# Altium footprint library SMD Passive.PcbLib: 136 footprints (part 2 of 9)
Each footprint in its own frame and in the unit in brackets; x right, y up, seen from the top. Pads: shape width x height; smd on the part's side, far side on the other; paste and mask are expansions set on the pad; w line width, h text height; cw(c..) or ccw(c..) is an arc to the next point about the centre after c.
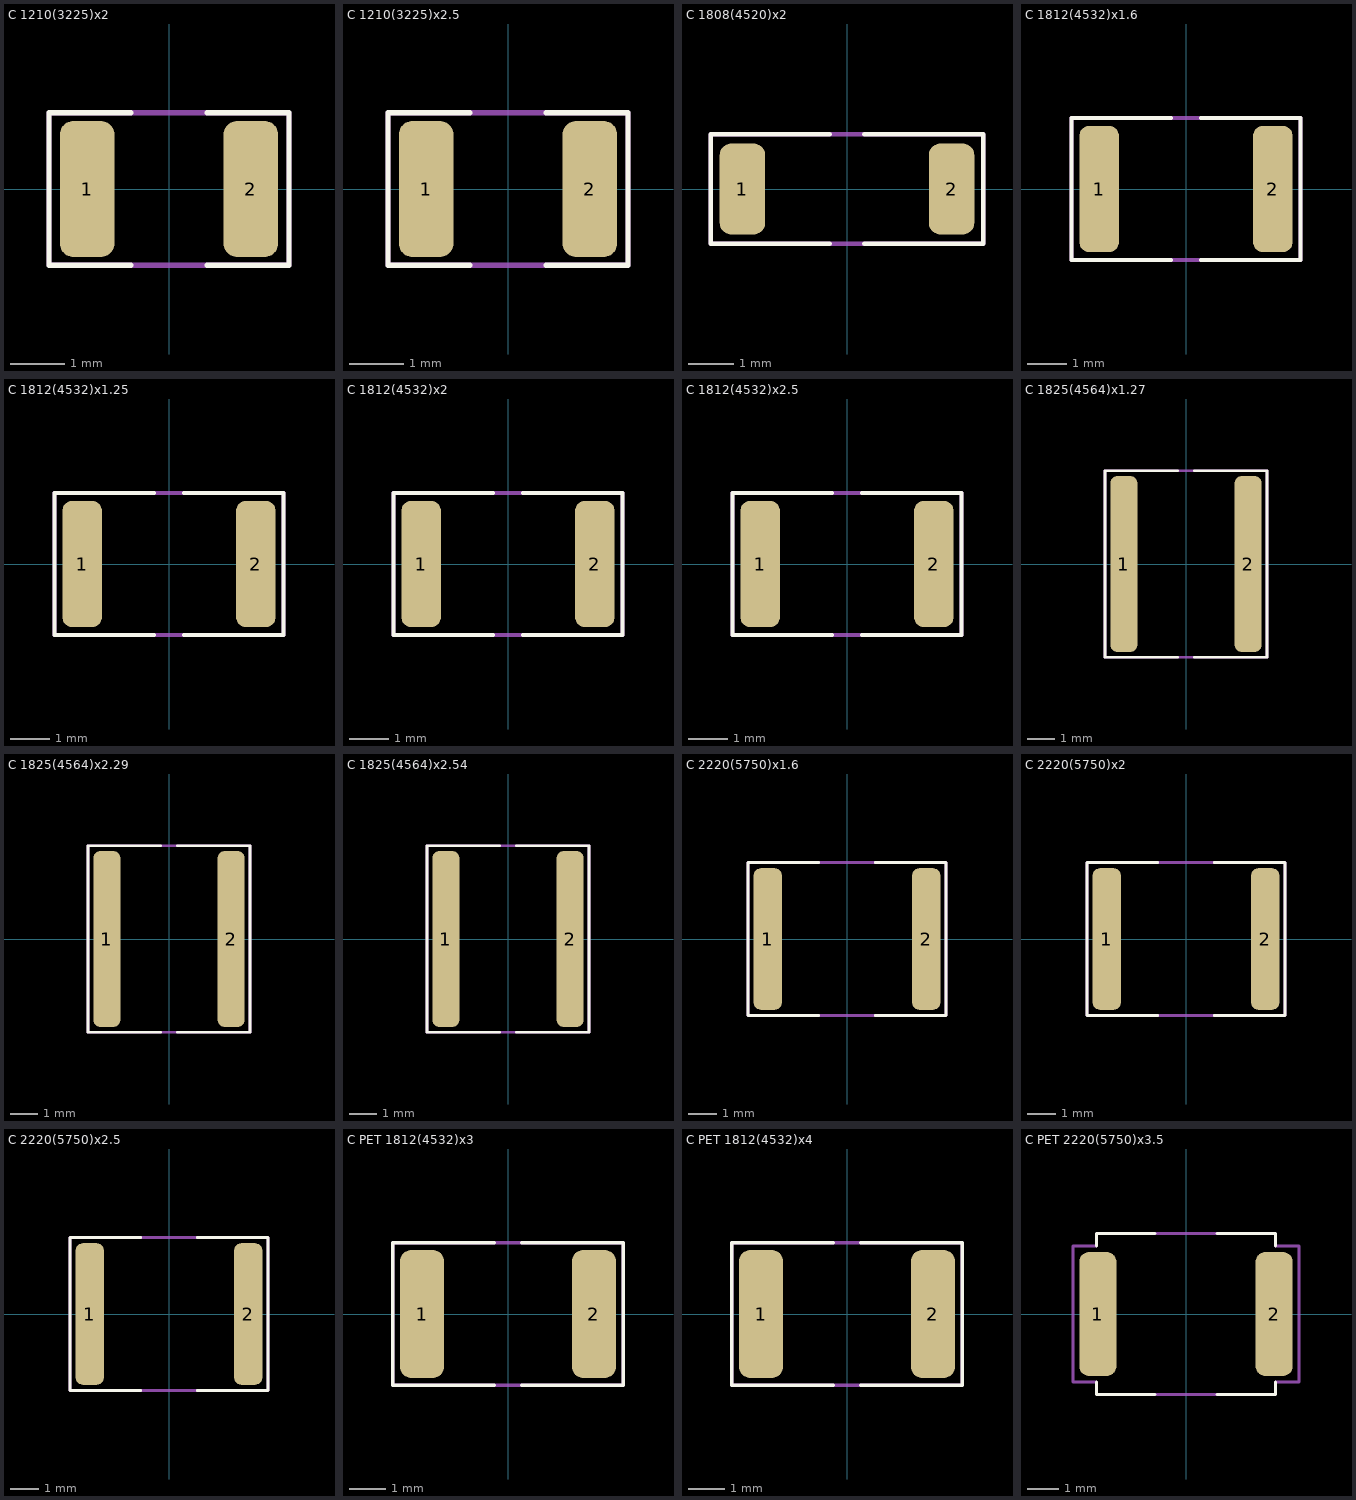
[diagram p1: the footprints below, top view; thin cyan lines are the x and y axes]

## C 1210(3225)x2 [mm]
height 2
pads (2):
  rrect50% 1x2.5 smd: 1(-1.5,0) 2(1.5,0)
Top Overlay:
  lines w0.1: -0.7,-1.4 -2.2,-1.4 -2.2,1.4 -0.7,1.4 ; 0.7,-1.4 2.2,-1.4 2.2,1.4 0.7,1.4
Top Courtyard:
  lines w0.1: -2.2,-1.4 -2.2,1.4 2.2,1.4 2.2,-1.4 -2.2,-1.4
3D body "Cap 1210(3225)x200N.STEP": height 2.01, standoff 0, extent -1.6,-1.25 1.6,1.25

## C 1210(3225)x2.5 [mm]
height 2.5
pads (2):
  rrect50% 1x2.5 smd: 1(-1.5,0) 2(1.5,0)
Top Overlay:
  lines w0.1: -0.7,-1.4 -2.2,-1.4 -2.2,1.4 -0.7,1.4 ; 0.7,-1.4 2.2,-1.4 2.2,1.4 0.7,1.4
Top Courtyard:
  lines w0.1: -2.2,-1.4 -2.2,1.4 2.2,1.4 2.2,-1.4 -2.2,-1.4
3D body "Cap 1210(3225)x250N.STEP": height 2.51, standoff 0, extent -1.6,-1.25 1.6,1.25

## C 1808(4520)x2 [mm]
height 2
pads (2):
  rrect50% 1x2 smd: 1(-2.3,0) 2(2.3,0)
Top Overlay:
  lines w0.1: -0.375,-1.2 -3,-1.2 -3,1.2 -0.375,1.2 ; 0.375,-1.2 3,-1.2 3,1.2 0.375,1.2
Top Courtyard:
  lines w0.1: -3,-1.2 -3,1.2 3,1.2 3,-1.2 -3,-1.2
3D body "Cap 1808(4520)x200N.STEP": height 2.01, standoff 0, extent -2.35,-1 2.35,1

## C 1812(4532)x1.6 [mm]
height 1.6
pads (2):
  rrect50% 1x3.2 smd: 1(-2.2,0) 2(2.2,0)
Top Overlay:
  lines w0.1: -0.375,-1.8 -2.9,-1.8 -2.9,1.8 -0.375,1.8 ; 0.375,-1.8 2.9,-1.8 2.9,1.8 0.375,1.8
Top Courtyard:
  lines w0.1: -2.9,-1.8 -2.9,1.8 2.9,1.8 2.9,-1.8 -2.9,-1.8
3D body "Cap 1812(4532)x160N.STEP": height 1.61, standoff 0, extent -2.25,-1.6 2.25,1.6

## C 1812(4532)x1.25 [mm]
height 1.25
pads (2):
  rrect50% 1x3.2 smd: 1(-2.2,0) 2(2.2,0)
Top Overlay:
  lines w0.1: -0.375,-1.8 -2.9,-1.8 -2.9,1.8 -0.375,1.8 ; 0.375,-1.8 2.9,-1.8 2.9,1.8 0.375,1.8
Top Courtyard:
  lines w0.1: -2.9,-1.8 2.9,-1.8 2.9,1.8 -2.9,1.8 -2.9,-1.8
3D body "Cap 1812(4532)x125N.STEP": height 1.26, standoff 0, extent -2.25,-1.6 2.25,1.6

## C 1812(4532)x2 [mm]
height 2
pads (2):
  rrect50% 1x3.2 smd: 1(-2.2,0) 2(2.2,0)
Top Overlay:
  lines w0.1: -0.375,-1.8 -2.9,-1.8 -2.9,1.8 -0.375,1.8 ; 0.375,-1.8 2.9,-1.8 2.9,1.8 0.375,1.8
Top Courtyard:
  lines w0.1: -2.9,-1.8 -2.9,1.8 2.9,1.8 2.9,-1.8 -2.9,-1.8
3D body "Cap 1812(4532)x200N.STEP": height 2.01, standoff 0, extent -2.25,-1.6 2.25,1.6

## C 1812(4532)x2.5 [mm]
height 2.5
pads (2):
  rrect50% 1x3.2 smd: 1(-2.2,0) 2(2.2,0)
Top Overlay:
  lines w0.1: -0.375,-1.8 -2.9,-1.8 -2.9,1.8 -0.375,1.8 ; 0.375,-1.8 2.9,-1.8 2.9,1.8 0.375,1.8
Top Courtyard:
  lines w0.1: -2.9,-1.8 -2.9,1.8 2.9,1.8 2.9,-1.8 -2.9,-1.8
3D body "Cap 1812(4532)x250N.STEP": height 2.51, standoff 0, extent -2.25,-1.6 2.25,1.6

## C 1825(4564)x1.27 [mm]
height 1.27
pads (2):
  rrect50% 1x6.5 smd: 1(-2.3,0) 2(2.3,0)
Top Overlay:
  lines w0.1: -0.3,-3.45 -3,-3.45 -3,3.45 -0.3,3.45 ; 0.3,-3.45 3,-3.45 3,3.45 0.3,3.45
Top Courtyard:
  lines w0.1: -3,-3.45 3,-3.45 3,3.45 -3,3.45 -3,-3.45
3D body "Cap 1825(4564)x127N.STEP": height 1.28, standoff 0, extent -2.25,-3.2 2.25,3.2

## C 1825(4564)x2.29 [mm]
height 2.29
pads (2):
  rrect50% 1x6.5 smd: 1(-2.3,0) 2(2.3,0)
Top Overlay:
  lines w0.1: -0.3,-3.45 -3,-3.45 -3,3.45 -0.3,3.45 ; 0.3,-3.45 3,-3.45 3,3.45 0.3,3.45
Top Courtyard:
  lines w0.1: -3,-3.45 -3,3.45 3,3.45 3,-3.45 -3,-3.45
3D body "Cap 1825(4564)x229N.STEP": height 2.3, standoff 0, extent -2.25,-3.2 2.25,3.2

## C 1825(4564)x2.54 [mm]
height 2.54
pads (2):
  rrect50% 1x6.5 smd: 1(-2.3,0) 2(2.3,0)
Top Overlay:
  lines w0.1: -0.3,-3.45 -3,-3.45 -3,3.45 -0.3,3.45 ; 0.3,-3.45 3,-3.45 3,3.45 0.3,3.45
Top Courtyard:
  lines w0.1: -3,-3.45 3,-3.45 3,3.45 -3,3.45 -3,-3.45
3D body "Cap 1825(4564)x254N.STEP": height 2.55, standoff 0, extent -2.25,-3.2 2.25,3.2

## C 2220(5750)x1.6 [mm]
height 1.6
pads (2):
  rrect50% 1x5 smd: 1(-2.8,0) 2(2.8,0)
Top Overlay:
  lines w0.1: -1,-2.7 -3.5,-2.7 -3.5,2.7 -1,2.7 ; 1,-2.7 3.5,-2.7 3.5,2.7 1,2.7
Top Courtyard:
  lines w0.1: -3.5,-2.7 3.5,-2.7 3.5,2.7 -3.5,2.7 -3.5,-2.7
3D body "Cap 2220(5750)x160N.STEP": height 1.61, standoff 0, extent -2.85,-2.5 2.85,2.5

## C 2220(5750)x2 [mm]
height 2
pads (2):
  rrect50% 1x5 smd: 1(-2.8,0) 2(2.8,0)
Top Overlay:
  lines w0.1: -1,-2.7 -3.5,-2.7 -3.5,2.7 -1,2.7 ; 1,-2.7 3.5,-2.7 3.5,2.7 1,2.7
Top Courtyard:
  lines w0.1: -3.5,-2.7 -3.5,2.7 3.5,2.7 3.5,-2.7 -3.5,-2.7
3D body "Cap 2220(5750)x200N.STEP": height 2.01, standoff 0, extent -2.85,-2.5 2.85,2.5

## C 2220(5750)x2.5 [mm]
height 2.5
pads (2):
  rrect50% 1x5 smd: 1(-2.8,0) 2(2.8,0)
Top Overlay:
  lines w0.1: -1,-2.7 -3.5,-2.7 -3.5,2.7 -1,2.7 ; 1,-2.7 3.5,-2.7 3.5,2.7 1,2.7
Top Courtyard:
  lines w0.1: -3.5,-2.7 3.5,-2.7 3.5,2.7 -3.5,2.7 -3.5,-2.7
3D body "Cap 2220(5750)x250N.STEP": height 2.51, standoff 0, extent -2.85,-2.5 2.85,2.5

## C PET 1812(4532)x3 [mm]
height 3
pads (2):
  rrect50% 1.2x3.5 smd: 1(-2.35,0) 2(2.35,0)
Top Overlay:
  lines w0.1: -0.375,-1.95 -3.15,-1.95 -3.15,1.95 -0.375,1.95 ; 0.375,-1.95 3.15,-1.95 3.15,1.95 0.375,1.95
Top Courtyard:
  lines w0.1: -3.15,-1.95 3.15,-1.95 3.15,1.95 -3.15,1.95 -3.15,-1.95
3D body "Cap 1812x3.0.STEP": height 3, standoff 0, extent -2.4,-1.65 2.4,1.65

## C PET 1812(4532)x4 [mm]
height 4
pads (2):
  rrect50% 1.2x3.5 smd: 1(-2.35,0) 2(2.35,0)
Top Overlay:
  lines w0.1: -0.375,-1.95 -3.15,-1.95 -3.15,1.95 -0.375,1.95 ; 0.375,-1.95 3.15,-1.95 3.15,1.95 0.375,1.95
Top Courtyard:
  lines w0.1: -3.15,-1.95 3.15,-1.95 3.15,1.95 -3.15,1.95 -3.15,-1.95
3D body "Cap 1812x4.0.STEP": height 4, standoff 0, extent -2.4,-1.65 2.4,1.65

## C PET 2220(5750)x3.5 [mm]
height 3.5
pads (2):
  rrect50% 1.2x4 smd: 1(-2.85,0) 2(2.85,0)
Top Overlay:
  lines w0.1: -2.9,-2.2 -2.9,-2.6 -1,-2.6 ; -2.9,2.2 -2.9,2.6 -1,2.6 ; 1,-2.6 2.9,-2.6 2.9,-2.2 ; 1,2.6 2.9,2.6 2.9,2.2
Top Courtyard:
  lines w0.1: 2.894,-2.6 2.9,-2.6 ; 2.9,-2.6 -2.9,-2.6 -2.9,-2.2 -3.65,-2.2 -3.65,2.2 -2.9,2.2 -2.9,2.6 2.9,2.6 2.9,2.2 3.65,2.2 3.65,-2.2 2.9,-2.2 2.9,-2.6
3D body "Cap 2220x3.5.STEP": height 3.5, standoff 0, extent -2.85,-2.55 2.85,2.55